# Altium footprint library Sockets.PcbLib: 80 footprints (part 5 of 6)
Each footprint in its own frame and in the unit in brackets; x right, y up, seen from the top. Pads: shape width x height; smd on the part's side, far side on the other; paste and mask are expansions set on the pad; w line width, h text height; cw(c..) or ccw(c..) is an arc to the next point about the centre after c.
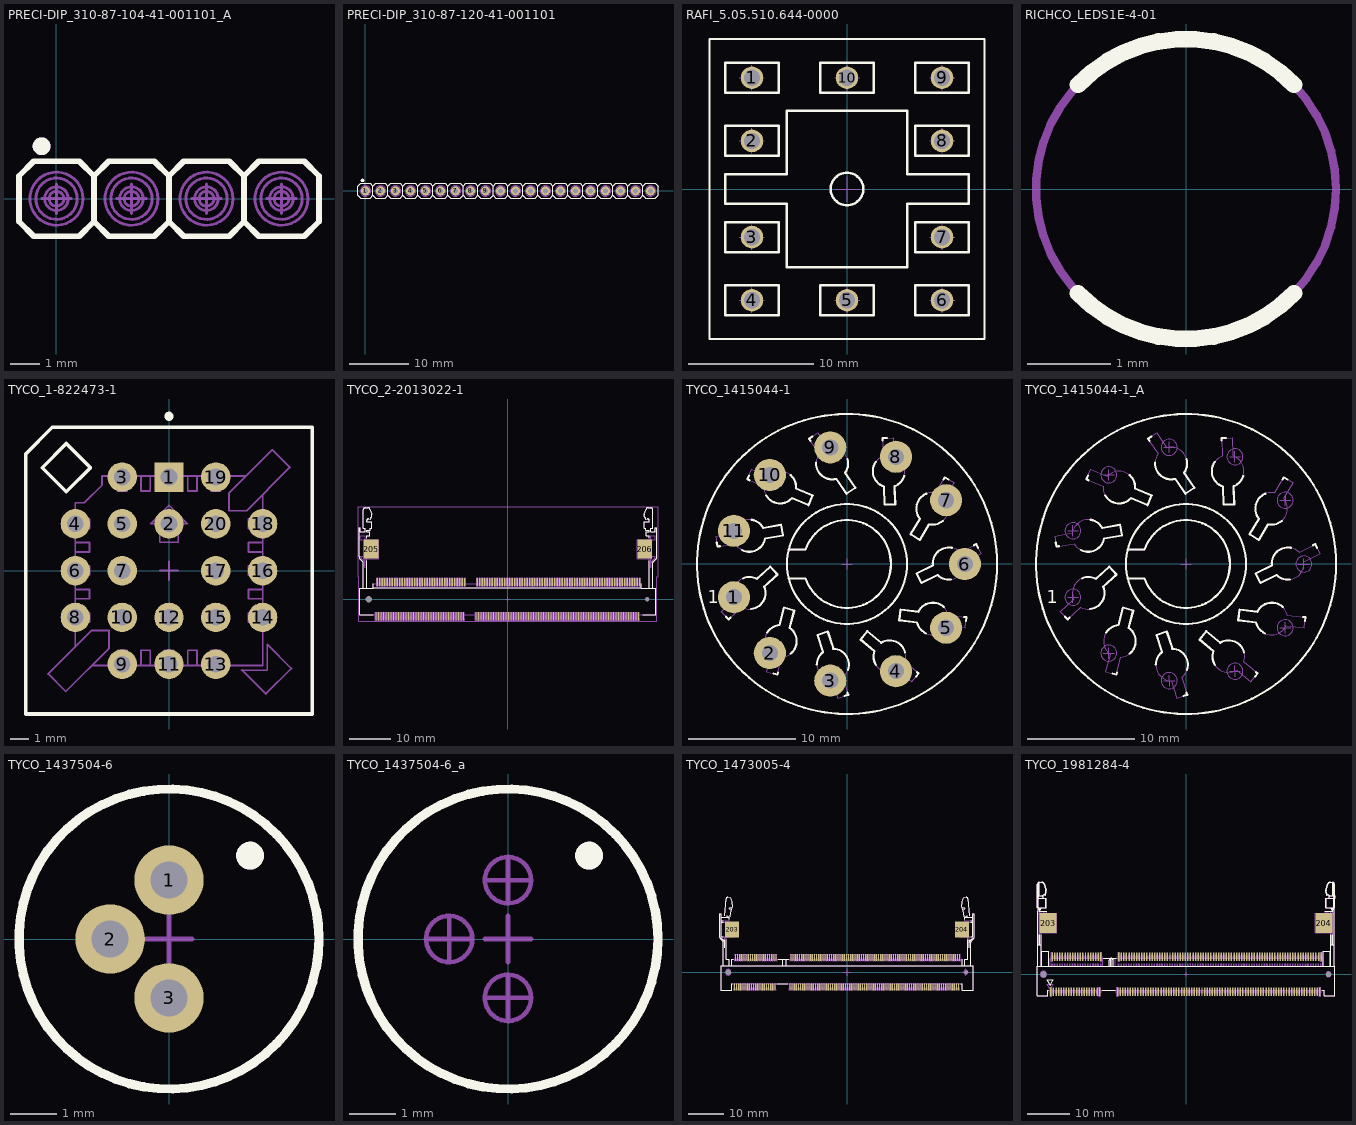
[diagram p4: the footprints below, top view; thin cyan lines are the x and y axes]

## PRECI-DIP_310-87-104-41-001101_A [mm] "4 Contact 2.54mm Pitch Single Row Socket Connector - Mating Pin  Ø0.47mm"
height 4.2
Top Overlay:
  circle w0.3: c-0.508,1.778 r0.15
  lines w0.2: 1.27,-0.77 1.77,-1.27 3.31,-1.27 3.81,-0.77 ; 1.27,-0.77 0.77,-1.27 -0.77,-1.27 -1.27,-0.77 -1.27,0.77 -0.77,1.27 0.77,1.27 1.27,0.77 ; 1.27,-0.77 1.27,0.77 ; 1.27,0.77 1.77,1.27 3.31,1.27 3.81,0.77 ; 3.81,-0.77 4.31,-1.27 5.85,-1.27 6.35,-0.77 ; 3.81,-0.77 3.81,0.77 ; 3.81,0.77 4.31,1.27 5.85,1.27 6.35,0.77 ; 6.35,-0.77 6.85,-1.27 8.39,-1.27 8.89,-0.77 8.89,0.77 8.39,1.27 6.85,1.27 6.35,0.77 ; 6.35,-0.77 6.35,0.77
Mechanical 8:
  lines w0.1: -0.5,0 0,0 ; 0,-0.5 0,0 ; 0,0.5 0,0 ; 0.5,0 0,0 ; 2.04,0 2.54,0 ; 2.54,-0.5 2.54,0 ; 2.54,0.5 2.54,0 ; 3.04,0 2.54,0 ; 4.58,0 5.08,0 ; 5.08,-0.5 5.08,0 ; 5.08,0.5 5.08,0 ; 5.58,0 5.08,0 ; 7.12,0 7.62,0 ; 7.62,-0.5 7.62,0 ; 7.62,0.5 7.62,0 ; 8.12,0 7.62,0
Mechanical 14:
  circle w0.3: c-0.508,1.778 r0.15
  circle w0.1: c7.62,0 r0.25
  circle w0.1: c7.62,0 r0.4
  circle w0.1: c7.62,0 r0.7
  circle w0.1: c7.62,0 r0.9
  circle w0.1: c5.08,0 r0.25
  circle w0.1: c5.08,0 r0.4
  circle w0.1: c5.08,0 r0.7
  circle w0.1: c5.08,0 r0.9
  circle w0.1: c2.54,0 r0.25
  circle w0.1: c2.54,0 r0.4
  circle w0.1: c2.54,0 r0.7
  circle w0.1: c2.54,0 r0.9
  circle w0.1: c0,0 r0.25
  circle w0.1: c0,0 r0.4
  circle w0.1: c0,0 r0.7
  circle w0.1: c0,0 r0.9
  lines w0.1: 1.27,-0.77 1.77,-1.27 3.31,-1.27 3.81,-0.77 ; 1.27,-0.77 0.77,-1.27 -0.77,-1.27 -1.27,-0.77 -1.27,0.77 -0.77,1.27 0.77,1.27 1.27,0.77 ; 1.27,-0.77 1.27,0.77 ; 1.27,0.77 1.77,1.27 3.31,1.27 3.81,0.77 ; 3.81,-0.77 4.31,-1.27 5.85,-1.27 6.35,-0.77 ; 3.81,-0.77 3.81,0.77 ; 3.81,0.77 4.31,1.27 5.85,1.27 6.35,0.77 ; 6.35,-0.77 6.85,-1.27 8.39,-1.27 8.89,-0.77 8.89,0.77 8.39,1.27 6.85,1.27 6.35,0.77 ; 6.35,-0.77 6.35,0.77
3D body "PRECI-DIP_310-87-104-41-205101.stp": height 4.2, standoff -3.17, extent -1.27,-1.27 8.89,1.27

## PRECI-DIP_310-87-120-41-001101 [mm] "20 Contact 2.54mm Pitch Single Row Socket Connector - Mating Pin  Ø0.47mm"
height 4.2
pads (20):
  round 1.5 hole 0.8: 1(0,0) 2(2.54,0) 3(5.08,0) 4(7.62,0) 5(10.16,0) 6(12.7,0) 7(15.24,0) 8(17.78,0) 9(20.32,0) 10(22.86,0) 11(25.4,0) 12(27.94,0) 13(30.48,0) 14(33.02,0) 15(35.56,0) 16(38.1,0) 17(40.64,0) 18(43.18,0) 19(45.72,0) 20(48.26,0)
Top Overlay:
  circle w0.3: c-0.508,1.778 r0.15
  lines w0.2: 1.27,-0.77 1.77,-1.27 3.31,-1.27 3.81,-0.77 ; 1.27,-0.77 0.77,-1.27 -0.77,-1.27 -1.27,-0.77 -1.27,0.77 -0.77,1.27 0.77,1.27 1.27,0.77 ; 1.27,-0.77 1.27,0.77 ; 1.27,0.77 1.77,1.27 3.31,1.27 3.81,0.77 ; 3.81,-0.77 4.31,-1.27 5.85,-1.27 6.35,-0.77 ; 3.81,-0.77 3.81,0.77 ; 3.81,0.77 4.31,1.27 5.85,1.27 6.35,0.77 ; 6.35,-0.77 6.85,-1.27 8.39,-1.27 8.89,-0.77 ; 6.35,-0.77 6.35,0.77 ; 6.35,0.77 6.85,1.27 8.39,1.27 8.89,0.77 ; 8.89,-0.77 9.39,-1.27 10.93,-1.27 11.43,-0.77 ; 8.89,-0.77 8.89,0.77 ; 8.89,0.77 9.39,1.27 10.93,1.27 11.43,0.77 ; 11.43,-0.77 11.93,-1.27 13.47,-1.27 13.97,-0.77 ; 11.43,-0.77 11.43,0.77 ; 11.43,0.77 11.93,1.27 13.47,1.27 13.97,0.77 ; 13.97,-0.77 14.47,-1.27 16.01,-1.27 16.51,-0.77 ; 13.97,-0.77 13.97,0.77 ; 13.97,0.77 14.47,1.27 16.01,1.27 16.51,0.77 ; 16.51,-0.77 17.01,-1.27 18.55,-1.27 19.05,-0.77 ; 16.51,-0.77 16.51,0.77 ; 16.51,0.77 17.01,1.27 18.55,1.27 19.05,0.77 ; 19.05,-0.77 19.55,-1.27 21.09,-1.27 21.59,-0.77 ; 19.05,-0.77 19.05,0.77 ; 19.05,0.77 19.55,1.27 21.09,1.27 21.59,0.77 ; 21.59,-0.77 22.09,-1.27 23.63,-1.27 24.13,-0.77 ; 21.59,-0.77 21.59,0.77 ; 21.59,0.77 22.09,1.27 23.63,1.27 24.13,0.77 ; 24.13,-0.77 24.63,-1.27 26.17,-1.27 26.67,-0.77 ; 24.13,-0.77 24.13,0.77 ; 24.13,0.77 24.63,1.27 26.17,1.27 26.67,0.77 ; 26.67,-0.77 27.17,-1.27 28.71,-1.27 29.21,-0.77 ; 26.67,-0.77 26.67,0.77 ; 26.67,0.77 27.17,1.27 28.71,1.27 29.21,0.77 ; 29.21,-0.77 29.71,-1.27 31.25,-1.27 31.75,-0.77 ; 29.21,-0.77 29.21,0.77 ; 29.21,0.77 29.71,1.27 31.25,1.27 31.75,0.77 ; 31.75,-0.77 32.25,-1.27 33.79,-1.27 34.29,-0.77 ; 31.75,-0.77 31.75,0.77 ; 31.75,0.77 32.25,1.27 33.79,1.27 34.29,0.77 ; 34.29,-0.77 34.79,-1.27 36.33,-1.27 36.83,-0.77 ; 34.29,-0.77 34.29,0.77 ; 34.29,0.77 34.79,1.27 36.33,1.27 36.83,0.77 ; 36.83,-0.77 37.33,-1.27 38.87,-1.27 39.37,-0.77 ; 36.83,-0.77 36.83,0.77 ; 36.83,0.77 37.33,1.27 38.87,1.27 39.37,0.77 ; 39.37,-0.77 39.87,-1.27 41.41,-1.27 41.91,-0.77 ; 39.37,-0.77 39.37,0.77 ; 39.37,0.77 39.87,1.27 41.41,1.27 41.91,0.77 ; 41.91,-0.77 42.41,-1.27 43.95,-1.27 44.45,-0.77 ; 41.91,-0.77 41.91,0.77 ; 41.91,0.77 42.41,1.27 43.95,1.27 44.45,0.77 ; 44.45,-0.77 44.95,-1.27 46.49,-1.27 46.99,-0.77 ; 44.45,-0.77 44.45,0.77 ; 44.45,0.77 44.95,1.27 46.49,1.27 46.99,0.77 ; 46.99,-0.77 47.49,-1.27 49.03,-1.27 49.53,-0.77 49.53,0.77 49.03,1.27 47.49,1.27 46.99,0.77 ; 46.99,-0.77 46.99,0.77
Mechanical 8:
  lines w0.1: -0.5,0 0,0 ; 0,-0.5 0,0 ; 0,0.5 0,0 ; 0.5,0 0,0 ; 2.04,0 2.54,0 ; 2.54,-0.5 2.54,0 ; 2.54,0.5 2.54,0 ; 3.04,0 2.54,0 ; 4.58,0 5.08,0 ; 5.08,-0.5 5.08,0 ; 5.08,0.5 5.08,0 ; 5.58,0 5.08,0 ; 7.12,0 7.62,0 ; 7.62,-0.5 7.62,0 ; 7.62,0.5 7.62,0 ; 8.12,0 7.62,0 ; 9.66,0 10.16,0 ; 10.16,-0.5 10.16,0 ; 10.16,0.5 10.16,0 ; 10.66,0 10.16,0 ; 12.2,0 12.7,0 ; 12.7,-0.5 12.7,0 ; 12.7,0.5 12.7,0 ; 13.2,0 12.7,0 ; 14.74,0 15.24,0 ; 15.24,-0.5 15.24,0 ; 15.24,0.5 15.24,0 ; 15.74,0 15.24,0 ; 17.28,0 17.78,0 ; 17.78,-0.5 17.78,0 ; 17.78,0.5 17.78,0 ; 18.28,0 17.78,0 ; 19.82,0 20.32,0 ; 20.32,-0.5 20.32,0 ; 20.32,0.5 20.32,0 ; 20.82,0 20.32,0 ; 22.36,0 22.86,0 ; 22.86,-0.5 22.86,0 ; 22.86,0.5 22.86,0 ; 23.36,0 22.86,0 ; 24.9,0 25.4,0 ; 25.4,-0.5 25.4,0 ; 25.4,0.5 25.4,0 ; 25.9,0 25.4,0 ; 27.44,0 27.94,0 ; 27.94,-0.5 27.94,0 ; 27.94,0.5 27.94,0 ; 28.44,0 27.94,0 ; 29.98,0 30.48,0 ; 30.48,-0.5 30.48,0 ; 30.48,0.5 30.48,0 ; 30.98,0 30.48,0 ; 32.52,0 33.02,0 ; 33.02,-0.5 33.02,0 ; 33.02,0.5 33.02,0 ; 33.52,0 33.02,0 ; 35.06,0 35.56,0 ; 35.56,-0.5 35.56,0 ; 35.56,0.5 35.56,0 ; 36.06,0 35.56,0 ; 37.6,0 38.1,0 ; 38.1,-0.5 38.1,0 ; 38.1,0.5 38.1,0 ; 38.6,0 38.1,0 ; 40.14,0 40.64,0 ; 40.64,-0.5 40.64,0 ; 40.64,0.5 40.64,0 ; 41.14,0 40.64,0 ; 42.68,0 43.18,0 ; 43.18,-0.5 43.18,0 ; 43.18,0.5 43.18,0 ; 43.68,0 43.18,0 ; 45.22,0 45.72,0 ; 45.72,-0.5 45.72,0 ; 45.72,0.5 45.72,0 ; 46.22,0 45.72,0 ; 47.76,0 48.26,0 ; 48.26,-0.5 48.26,0 ; 48.26,0.5 48.26,0 ; 48.76,0 48.26,0
Mechanical 14:
  drawing of 222 lines, arcs and shapes, not listed
3D body "PRECI-DIP_310-87-120-41-001101.stp": height 4.2, standoff -3.17, extent -1.27,-1.27 49.53,1.27

## RAFI_5.05.510.644-0000 [mm] "PCB plug-in socket, 10 contacts, RAFIX 16 Serie"
height 10.5
pads (10):
  round 1.8 hole 1.3: 1(-7.6,8.9) 2(-7.6,3.85) 3(-7.6,-3.85) 4(-7.6,-8.9) 5(0,-8.9) 6(7.6,-8.9) 7(7.6,-3.85) 8(7.6,3.85) 9(7.6,8.9) 10(0,8.9)
Top Overlay:
  circle w0.2: c0,0 r1.3
  lines w0.2: -11,-12 11,-12 11,12 -11,12 -11,-12 ; -9.75,-10.1 -5.45,-10.1 -5.45,-7.7 -9.75,-7.7 -9.75,-10.1 ; -9.75,-5.05 -5.45,-5.05 -5.45,-2.65 -9.75,-2.65 -9.75,-5.05 ; -9.75,-1.2 -4.8,-1.2 -4.8,-6.25 4.8,-6.25 4.8,-1.2 9.75,-1.2 9.75,1.2 4.8,1.2 4.8,6.25 -4.8,6.25 -4.8,1.2 -9.75,1.2 -9.75,-1.2 ; -9.75,2.65 -5.45,2.65 -5.45,5.05 -9.75,5.05 -9.75,2.65 ; -9.75,7.7 -5.45,7.7 -5.45,10.1 -9.75,10.1 -9.75,7.7 ; -2.15,-10.1 2.15,-10.1 2.15,-7.7 -2.15,-7.7 -2.15,-10.1 ; -2.15,7.7 2.15,7.7 2.15,10.1 -2.15,10.1 -2.15,7.7 ; 5.45,-10.1 9.75,-10.1 9.75,-7.7 5.45,-7.7 5.45,-10.1 ; 5.45,-5.05 9.75,-5.05 9.75,-2.65 5.45,-2.65 5.45,-5.05 ; 5.45,2.65 9.75,2.65 9.75,5.05 5.45,5.05 5.45,2.65 ; 5.45,7.7 9.75,7.7 9.75,10.1 5.45,10.1 5.45,7.7
Mechanical 8:
  lines w0.1: -8.6,-8.9 -7.6,-8.9 ; -8.6,-3.85 -7.6,-3.85 ; -8.6,3.85 -7.6,3.85 ; -8.6,8.9 -7.6,8.9 ; -7.6,-9.9 -7.6,-8.9 ; -7.6,-7.9 -7.6,-8.9 ; -7.6,-4.85 -7.6,-3.85 ; -7.6,-2.85 -7.6,-3.85 ; -7.6,2.85 -7.6,3.85 ; -7.6,4.85 -7.6,3.85 ; -7.6,7.9 -7.6,8.9 ; -7.6,9.9 -7.6,8.9 ; -6.6,-8.9 -7.6,-8.9 ; -6.6,-3.85 -7.6,-3.85 ; -6.6,3.85 -7.6,3.85 ; -6.6,8.9 -7.6,8.9 ; -1,-8.9 0,-8.9 ; -1,0 0,0 ; -1,8.9 0,8.9 ; 0,-9.9 0,-8.9 ; 0,-7.9 0,-8.9 ; 0,-1 0,0 ; 0,1 0,0 ; 0,7.9 0,8.9 ; 0,9.9 0,8.9 ; 1,-8.9 0,-8.9 ; 1,0 0,0 ; 1,8.9 0,8.9 ; 6.6,-8.9 7.6,-8.9 ; 6.6,-3.85 7.6,-3.85 ; 6.6,3.85 7.6,3.85 ; 6.6,8.9 7.6,8.9 ; 7.6,-9.9 7.6,-8.9 ; 7.6,-7.9 7.6,-8.9 ; 7.6,-4.85 7.6,-3.85 ; 7.6,-2.85 7.6,-3.85 ; 7.6,2.85 7.6,3.85 ; 7.6,4.85 7.6,3.85 ; 7.6,7.9 7.6,8.9 ; 7.6,9.9 7.6,8.9 ; 8.6,-8.9 7.6,-8.9 ; 8.6,-3.85 7.6,-3.85 ; 8.6,3.85 7.6,3.85 ; 8.6,8.9 7.6,8.9
Mechanical 14:
  circle w0.1: c0,0 r1.3
  lines w0.1: -11,-12 11,-12 11,12 -11,12 -11,-12 ; -9.75,-10.1 -5.45,-10.1 -5.45,-7.7 -9.75,-7.7 -9.75,-10.1 ; -9.75,-5.05 -5.45,-5.05 -5.45,-2.65 -9.75,-2.65 -9.75,-5.05 ; -9.75,-1.2 -4.8,-1.2 -4.8,-6.25 4.8,-6.25 4.8,-1.2 9.75,-1.2 9.75,1.2 4.8,1.2 4.8,6.25 -4.8,6.25 -4.8,1.2 -9.75,1.2 -9.75,-1.2 ; -9.75,2.65 -5.45,2.65 -5.45,5.05 -9.75,5.05 -9.75,2.65 ; -9.75,7.7 -5.45,7.7 -5.45,10.1 -9.75,10.1 -9.75,7.7 ; -2.15,-10.1 2.15,-10.1 2.15,-7.7 -2.15,-7.7 -2.15,-10.1 ; -2.15,7.7 2.15,7.7 2.15,10.1 -2.15,10.1 -2.15,7.7 ; 5.45,-10.1 9.75,-10.1 9.75,-7.7 5.45,-7.7 5.45,-10.1 ; 5.45,-5.05 9.75,-5.05 9.75,-2.65 5.45,-2.65 5.45,-5.05 ; 5.45,2.65 9.75,2.65 9.75,5.05 5.45,5.05 5.45,2.65 ; 5.45,7.7 9.75,7.7 9.75,10.1 5.45,10.1 5.45,7.7
3D body "RAFI_5.05.510.644-0000.stp": height 10.5, standoff -4, extent -11,-12 11,12

## RICHCO_LEDS1E-4-01 [mm] "6.4mm Spacer For 3mm LED - RICHCO LEDS1E Serie"
height 6.4
Top Overlay:
  lines w0.2: -1.296,-1.25 ccw(c0,0) 1.296,-1.25 ; -1.295,1.25 cw(c0,0) 1.295,1.25
Mechanical 14:
  circle w0.1: c0,0 r1.8
3D body "RICHCO_LEDS1E-4-01.stp": height 6.4, standoff 0, extent -1.729,-1.8 1.729,1.8

## TYCO_1-822473-1 [mm] "20 Leads PLCC Socket, Pitch 1.27 mm, Body 15.56x15.56mm"
height 8.1
pads (20):
  rect 1.6x1.6 hole 0.9: 1(0,5.08)
  round 1.6 hole 0.9: 2(0,2.54) 3(-2.54,5.08) 4(-5.08,2.54) 5(-2.54,2.54) 6(-5.08,0) 7(-2.54,0) 8(-5.08,-2.54) 9(-2.54,-5.08) 10(-2.54,-2.54) 11(0,-5.08) 12(0,-2.54) 13(2.54,-5.08) 14(5.08,-2.54) 15(2.54,-2.54) 16(5.08,0) 17(2.54,0) 18(5.08,2.54) 19(2.54,5.08) 20(2.54,2.54)
Top Overlay:
  circle w0.25: c0,8.375 r0.125
  lines w0.2: -7.78,-7.78 -7.78,6.33 -6.33,7.78 7.78,7.78 7.78,-7.78 -7.78,-7.78 ; -6.882,5.588 -5.574,6.896 -4.266,5.588 -5.574,4.28 -6.882,5.588
Mechanical 8:
  lines w0.1: -5.58,-2.54 -5.08,-2.54 ; -5.58,0 -5.08,0 ; -5.58,2.54 -5.08,2.54 ; -5.08,-3.04 -5.08,-2.54 ; -5.08,-2.04 -5.08,-2.54 ; -5.08,-0.5 -5.08,0 ; -5.08,0.5 -5.08,0 ; -5.08,2.04 -5.08,2.54 ; -5.08,3.04 -5.08,2.54 ; -4.58,-2.54 -5.08,-2.54 ; -4.58,0 -5.08,0 ; -4.58,2.54 -5.08,2.54 ; -3.04,-5.08 -2.54,-5.08 ; -3.04,-2.54 -2.54,-2.54 ; -3.04,0 -2.54,0 ; -3.04,2.54 -2.54,2.54 ; -3.04,5.08 -2.54,5.08 ; -2.54,-5.58 -2.54,-5.08 ; -2.54,-4.58 -2.54,-5.08 ; -2.54,-3.04 -2.54,-2.54 ; -2.54,-2.04 -2.54,-2.54 ; -2.54,-0.5 -2.54,0 ; -2.54,0.5 -2.54,0 ; -2.54,2.04 -2.54,2.54 ; -2.54,3.04 -2.54,2.54 ; -2.54,4.58 -2.54,5.08 ; -2.54,5.58 -2.54,5.08 ; -2.04,-5.08 -2.54,-5.08 ; -2.04,-2.54 -2.54,-2.54 ; -2.04,0 -2.54,0 ; -2.04,2.54 -2.54,2.54 ; -2.04,5.08 -2.54,5.08 ; -0.5,-5.08 0,-5.08 ; -0.5,-2.54 0,-2.54 ; -0.5,0 0,0 ; -0.5,2.54 0,2.54 ; -0.5,5.08 0,5.08 ; 0,-5.58 0,-5.08 ; 0,-4.58 0,-5.08 ; 0,-3.04 0,-2.54 ; 0,-2.04 0,-2.54 ; 0,-0.5 0,0 ; 0,0.5 0,0 ; 0,2.04 0,2.54 ; 0,3.04 0,2.54 ; 0,4.58 0,5.08 ; 0,5.58 0,5.08 ; 0.5,-5.08 0,-5.08 ; 0.5,-2.54 0,-2.54 ; 0.5,0 0,0 ; 0.5,2.54 0,2.54 ; 0.5,5.08 0,5.08 ; 2.04,-5.08 2.54,-5.08 ; 2.04,-2.54 2.54,-2.54 ; 2.04,0 2.54,0 ; 2.04,2.54 2.54,2.54 ; 2.04,5.08 2.54,5.08 ; 2.54,-5.58 2.54,-5.08 ; 2.54,-4.58 2.54,-5.08 ; 2.54,-3.04 2.54,-2.54 ; 2.54,-2.04 2.54,-2.54 ; 2.54,-0.5 2.54,0 ; 2.54,0.5 2.54,0 ; 2.54,2.04 2.54,2.54 ; 2.54,3.04 2.54,2.54 ; 2.54,4.58 2.54,5.08 ; 2.54,5.58 2.54,5.08 ; 3.04,-5.08 2.54,-5.08 ; 3.04,-2.54 2.54,-2.54 ; 3.04,0 2.54,0 ; 3.04,2.54 2.54,2.54 ; 3.04,5.08 2.54,5.08 ; 4.58,-2.54 5.08,-2.54 ; 4.58,0 5.08,0 ; 4.58,2.54 5.08,2.54 ; 5.08,-3.04 5.08,-2.54 ; 5.08,-2.04 5.08,-2.54 ; 5.08,-0.5 5.08,0 ; 5.08,0.5 5.08,0 ; 5.08,2.04 5.08,2.54 ; 5.08,3.04 5.08,2.54 ; 5.58,-2.54 5.08,-2.54 ; 5.58,0 5.08,0 ; 5.58,2.54 5.08,2.54
Mechanical 14:
  lines w0.1: -5.09,-4.135 -5.09,3.685 -4.59,3.685 -3.635,4.64 -3.635,5.14 4.185,5.14 ; -5.09,-2.794 -4.323,-2.794 -4.323,-2.286 -5.09,-2.286 ; -5.09,-1.524 -4.323,-1.524 -4.323,-1.016 -5.09,-1.016 ; -5.09,-0.254 -4.323,-0.254 -4.323,0.254 -5.09,0.254 ; -5.09,1.016 -4.323,1.016 -4.323,1.524 -5.09,1.524 ; -5.09,2.286 -4.323,2.286 -4.323,2.794 -5.09,2.794 ; -4.185,-5.14 5.09,-5.14 5.09,4.135 ; -2.794,-5.14 -2.794,-4.323 -2.286,-4.323 -2.286,-5.14 ; -2.794,5.14 -2.794,4.323 -2.286,4.323 -2.286,5.14 ; -1.524,-5.14 -1.524,-4.323 -1.016,-4.323 -1.016,-5.14 ; -1.524,5.14 -1.524,4.323 -1.016,4.323 -1.016,5.14 ; -0.254,-5.14 -0.254,-4.323 0.254,-4.323 0.254,-5.14 ; -0.254,5.14 -0.254,4.323 0.254,4.323 0.254,5.14 ; 1.016,-5.14 1.016,-4.323 1.524,-4.323 1.524,-5.14 ; 1.016,5.14 1.016,4.323 1.524,4.323 1.524,5.14 ; 2.286,-5.14 2.286,-4.323 2.794,-4.323 2.794,-5.14 ; 2.286,5.14 2.286,4.323 2.794,4.323 2.794,5.14 ; 3.93,-5.405 5.332,-5.405 5.332,-4.003 6.64,-5.311 5.261,-6.69 3.953,-5.382 ; 5.09,-2.794 4.323,-2.794 4.323,-2.286 5.09,-2.286 ; 5.09,-1.524 4.323,-1.524 4.323,-1.016 5.09,-1.016 ; 5.09,-0.254 4.323,-0.254 4.323,0.254 5.09,0.254 ; 5.09,1.016 4.323,1.016 4.323,1.524 5.09,1.524 ; 5.09,2.286 4.323,2.286 4.323,2.794 5.09,2.794 ; -7.78,-7.78 -7.78,6.33 -6.33,7.78 7.78,7.78 7.78,-7.78 -7.78,-7.78 ; -6.882,5.588 -5.574,6.896 -4.266,5.588 -5.574,4.28 -6.882,5.588 ; -6.558,-5.604 -5.604,-6.558 -3.253,-4.207 -3.253,-3.253 -4.207,-3.253 -6.558,-5.604 ; -1,2.54 -0.5,2.54 -0.5,1.54 0.5,1.54 0.5,2.54 1,2.54 0,3.54 -1,2.54 ; 3.253,3.253 4.207,3.253 6.558,5.604 5.604,6.558 3.253,4.207 3.253,3.253
3D body "TYCO_1-822473-1.stp": height 8.55, standoff -3.2, extent -7.78,-7.78 7.78,7.78

## TYCO_2-2013022-1 [mm] "DDR3 SODIMM Socket 0.6mm Pitch 204 Positions"
height 4.6
pads (208):
  rect 0.35x2 smd: 1(-31.65,-4.1) 2(-31.35,4.1) 3(-31.05,-4.1) 4(-30.75,4.1) 5(-30.45,-4.1) 6(-30.15,4.1) 7(-29.85,-4.1) 8(-29.55,4.1) 9(-29.25,-4.1) 10(-28.95,4.1) 11(-28.65,-4.1) 12(-28.35,4.1) 13(-28.05,-4.1) 14(-27.75,4.1) 15(-27.45,-4.1) 16(-27.15,4.1) 17(-26.85,-4.1) 18(-26.55,4.1) 19(-26.25,-4.1) 20(-25.95,4.1) 21(-25.65,-4.1) 22(-25.35,4.1) 23(-25.05,-4.1) 24(-24.75,4.1) 25(-24.45,-4.1) 26(-24.15,4.1) 27(-23.85,-4.1) 28(-23.55,4.1) 29(-23.25,-4.1) 30(-22.95,4.1) 31(-22.65,-4.1) 32(-22.35,4.1) 33(-22.05,-4.1) 34(-21.75,4.1) 35(-21.45,-4.1) 36(-21.15,4.1) 37(-20.85,-4.1) 38(-20.55,4.1) 39(-20.25,-4.1) 40(-19.95,4.1) 41(-19.65,-4.1) 42(-19.35,4.1) 43(-19.05,-4.1) 44(-18.75,4.1) 45(-18.45,-4.1) 46(-18.15,4.1) 47(-17.85,-4.1) 48(-17.55,4.1) 49(-17.25,-4.1) 50(-16.95,4.1) 51(-16.65,-4.1) 52(-16.35,4.1) 53(-16.05,-4.1) 54(-15.75,4.1) 55(-15.45,-4.1) 56(-15.15,4.1) 57(-14.85,-4.1) 58(-14.55,4.1) 59(-14.25,-4.1) 60(-13.95,4.1) 61(-13.65,-4.1) 62(-13.35,4.1) 63(-13.05,-4.1) 64(-12.75,4.1) 65(-12.45,-4.1) 66(-12.15,4.1) 67(-11.85,-4.1) 68(-11.55,4.1) 69(-11.25,-4.1) 70(-10.95,4.1) 71(-10.65,-4.1) 72(-10.35,4.1) 73(-7.65,-4.1) 74(-7.35,4.1) 75(-7.05,-4.1) 76(-6.75,4.1) 77(-6.45,-4.1) 78(-6.15,4.1) 79(-5.85,-4.1) 80(-5.55,4.1) 81(-5.25,-4.1) 82(-4.95,4.1) 83(-4.65,-4.1) 84(-4.35,4.1) 85(-4.05,-4.1) 86(-3.75,4.1) 87(-3.45,-4.1) 88(-3.15,4.1) 89(-2.85,-4.1) 90(-2.55,4.1) 91(-2.25,-4.1) 92(-1.95,4.1) 93(-1.65,-4.1) 94(-1.35,4.1) 95(-1.05,-4.1) 96(-0.75,4.1) 97(-0.45,-4.1) 98(-0.15,4.1) 99(0.15,-4.1) 100(0.45,4.1) 101(0.75,-4.1) 102(1.05,4.1) 103(1.35,-4.1) 104(1.65,4.1) 105(1.95,-4.1) 106(2.25,4.1) 107(2.55,-4.1) 108(2.85,4.1) 109(3.15,-4.1) 110(3.45,4.1) 111(3.75,-4.1) 112(4.05,4.1) 113(4.35,-4.1) 114(4.65,4.1) 115(4.95,-4.1) 116(5.25,4.1) 117(5.55,-4.1) 118(5.85,4.1) 119(6.15,-4.1) 120(6.45,4.1) 121(6.75,-4.1) 122(7.05,4.1) 123(7.35,-4.1) 124(7.65,4.1) 125(7.95,-4.1) 126(8.25,4.1) 127(8.55,-4.1) 128(8.85,4.1) 129(9.15,-4.1) 130(9.45,4.1) 131(9.75,-4.1) 132(10.05,4.1) 133(10.35,-4.1) 134(10.65,4.1) 135(10.95,-4.1) 136(11.25,4.1) 137(11.55,-4.1) 138(11.85,4.1) 139(12.15,-4.1) 140(12.45,4.1) 141(12.75,-4.1) 142(13.05,4.1) 143(13.35,-4.1) 144(13.65,4.1) 145(13.95,-4.1) 146(14.25,4.1) 147(14.55,-4.1) 148(14.85,4.1) 149(15.15,-4.1) 150(15.45,4.1) 151(15.75,-4.1) 152(16.05,4.1) 153(16.35,-4.1) 154(16.65,4.1) 155(16.95,-4.1) 156(17.25,4.1) 157(17.55,-4.1) 158(17.85,4.1) 159(18.15,-4.1) 160(18.45,4.1) 161(18.75,-4.1) 162(19.05,4.1) 163(19.35,-4.1) 164(19.65,4.1) 165(19.95,-4.1) 166(20.25,4.1) 167(20.55,-4.1) 168(20.85,4.1) 169(21.15,-4.1) 170(21.45,4.1) 171(21.75,-4.1) 172(22.05,4.1) 173(22.35,-4.1) 174(22.65,4.1) 175(22.95,-4.1) 176(23.25,4.1) 177(23.55,-4.1) 178(23.85,4.1) 179(24.15,-4.1) 180(24.45,4.1) 181(24.75,-4.1) 182(25.05,4.1) 183(25.35,-4.1) 184(25.65,4.1) 185(25.95,-4.1) 186(26.25,4.1) 187(26.55,-4.1) 188(26.85,4.1) 189(27.15,-4.1) 190(27.45,4.1) 191(27.75,-4.1) 192(28.05,4.1) 193(28.35,-4.1) 194(28.65,4.1) 195(28.95,-4.1) 196(29.25,4.1) 197(29.55,-4.1) 198(29.85,4.1) 199(30.15,-4.1) 200(30.45,4.1) 201(30.75,-4.1) 202(31.05,4.1) 203(31.35,-4.1) 204(31.65,4.1)
  rect 3.5x4.6 smd: 205(-32.8,12) 206(32.8,12)
  round 0.5 hole 1.6 unplated: 207(-33.4,0)
  round 0.5 hole 1.1 unplated: 208(33.4,0)
Top Overlay:
  lines w0.2: -34.725,2.55 -34.725,8.65 ccw(c-35.111,8.725) -34.834,9.004 -35.507,9.642 cw(c-35.025,10.15) -35.725,10.15 -35.725,17.15 -35.375,17.15 -35.375,16.15 -34.275,16.15 -34.274,17.05 ; -34.275,17.05 -34.685,17.05 -34.685,21.45 cw(c-34.185,21.45) -34.185,21.95 -33.58,21.95 cw(c-33.58,21.45) -33.107,21.613 -32.671,20.348 cw(c-32.955,20.25) -32.655,20.25 -32.655,19.887 cw(c-32.955,19.887) -32.823,19.618 -32.933,19.564 -32.82,19.546 -32.875,19.2 -33.347,19.275 ccw(c-33.425,18.781) -33.925,18.781 -33.925,18.55 -32.727,18.55 -32.727,17.05 ; -33.925,2.55 -33.925,9.15 ; -33.925,14.7 -33.925,15.15 -33.125,15.15 -33.125,16.15 -33.925,16.15 -33.925,16.55 -33.075,16.55 -33.075,17.05 -32.725,17.05 ; -32.35,-3.7 -32.35,-3.8 -35.5,-3.8 -35.5,2.55 -32.35,2.55 -32.35,3.7 ; -32.35,2.7 32.05,2.7 ; 32.05,3.7 32.05,2.55 35.5,2.55 35.5,-3.8 32.35,-3.8 32.35,-3.7 ; 32.983,19.564 32.873,19.618 cw(c33.005,19.887) 32.705,19.887 32.705,20.25 cw(c33.005,20.25) 32.721,20.348 33.157,21.613 cw(c33.63,21.45) 33.63,21.95 34.235,21.95 cw(c34.235,21.45) 34.735,21.45 34.735,17.05 34.325,17.05 34.325,16.15 35.425,16.15 35.425,17.15 35.775,17.15 35.775,10.15 cw(c35.075,10.15) 35.557,9.642 34.884,9.004 ccw(c35.125,8.75) 34.775,8.75 34.775,2.55 ; 33.106,19.583 32.87,19.546 32.925,19.2 33.397,19.275 cw(c33.475,18.781) 33.975,18.781 33.975,18.55 32.775,18.55 32.775,17.05 33.125,17.05 33.125,16.55 33.975,16.55 33.975,16.15 33.175,16.15 33.175,15.15 33.975,15.15 33.975,14.7 ; 33.975,2.55 33.978,9.15
Mechanical 8:
  drawing of 1253 lines, arcs and shapes, not listed
Mechanical 14:
  lines w0.1: -34.725,2.55 -34.725,8.65 ccw(c-35.111,8.725) -34.834,9.004 -35.507,9.642 cw(c-35.025,10.15) -35.725,10.15 -35.725,17.15 -35.375,17.15 -35.375,16.15 -34.275,16.15 -34.274,17.05 ; -34.275,17.05 -34.685,17.05 -34.685,21.45 cw(c-34.185,21.45) -34.185,21.95 -33.58,21.95 cw(c-33.58,21.45) -33.107,21.613 -32.671,20.348 cw(c-32.955,20.25) -32.655,20.25 -32.655,19.887 cw(c-32.955,19.887) -32.823,19.618 -32.933,19.564 -32.82,19.546 -32.875,19.2 -33.347,19.275 ccw(c-33.425,18.781) -33.925,18.781 -33.925,18.55 -32.727,18.55 -32.727,17.05 ; -33.925,2.55 -33.925,10.7 -31.925,10.7 -31.675,10.95 -31.675,13.65 -31.925,13.9 -33.925,13.9 -33.925,15.15 -33.125,15.15 -33.125,16.15 -33.925,16.15 -33.925,16.55 -33.075,16.55 -33.075,17.05 -32.725,17.05 ; -32.35,2.7 32.05,2.7 ; 32.983,19.564 32.873,19.618 cw(c33.005,19.887) 32.705,19.887 32.705,20.25 cw(c33.005,20.25) 32.721,20.348 33.157,21.613 cw(c33.63,21.45) 33.63,21.95 34.235,21.95 cw(c34.235,21.45) 34.735,21.45 34.735,17.05 34.325,17.05 34.325,16.15 35.425,16.15 35.425,17.15 35.775,17.15 35.775,10.15 cw(c35.075,10.15) 35.557,9.642 34.884,9.004 ccw(c35.125,8.75) 34.775,8.75 34.775,2.55 ; 33.106,19.583 32.87,19.546 32.925,19.2 33.397,19.275 cw(c33.475,18.781) 33.975,18.781 33.975,18.55 32.775,18.55 32.775,17.05 33.125,17.05 33.125,16.55 33.975,16.55 33.975,16.15 33.175,16.15 33.175,15.15 33.975,15.15 33.975,13.9 31.975,13.9 31.725,13.65 31.725,10.95 31.975,10.7 33.978,10.7 33.975,2.55 ; -35.5,-3.8 -35.5,2.55 -32.35,2.55 -32.35,3.7 32.05,3.7 32.05,2.55 35.5,2.55 35.5,-3.8 32.35,-3.8 32.35,-3.7 -32.35,-3.7 -32.35,-3.8 -35.5,-3.8 ; -35.375,10.15 ccw(c-35.025,10.15) -35.266,9.896 -34.593,9.258 cw(c-35.075,8.75) -34.375,8.75 -34.375,7.6 -34.275,7.6 -34.275,10.3 -35.375,10.3 -35.375,10.15 ; -35.375,14.3 -35.375,15.15 -34.275,15.15 -34.275,14.3 -35.375,14.3 ; 34.325,7.6 34.325,10.3 35.425,10.3 35.425,10.15 cw(c35.075,10.15) 35.316,9.896 34.643,9.258 ccw(c35.125,8.75) 34.425,8.75 34.425,7.6 34.325,7.6 ; 34.325,14.3 34.325,15.15 35.425,15.15 35.425,14.3 34.325,14.3
Mechanical 15:
  lines w0.05: -35.975,5.35 -35.975,22.2 36.025,22.2 36.025,5.35 35.75,5.35 35.75,-5.35 -35.75,-5.35 -35.75,5.35 -35.975,5.35
3D body "TYCO_2-2013022-1.stp": height 4.1, standoff -0.7, extent -35.75,-4.5 35.75,21.95
